# Altium footprint library ThroHoleCap.PcbLib: 81 footprints (part 1 of 6)
Each footprint in its own frame and in the unit in brackets; x right, y up, seen from the top. Pads: shape width x height; smd on the part's side, far side on the other; paste and mask are expansions set on the pad; w line width, h text height; cw(c..) or ccw(c..) is an arc to the next point about the centre after c.
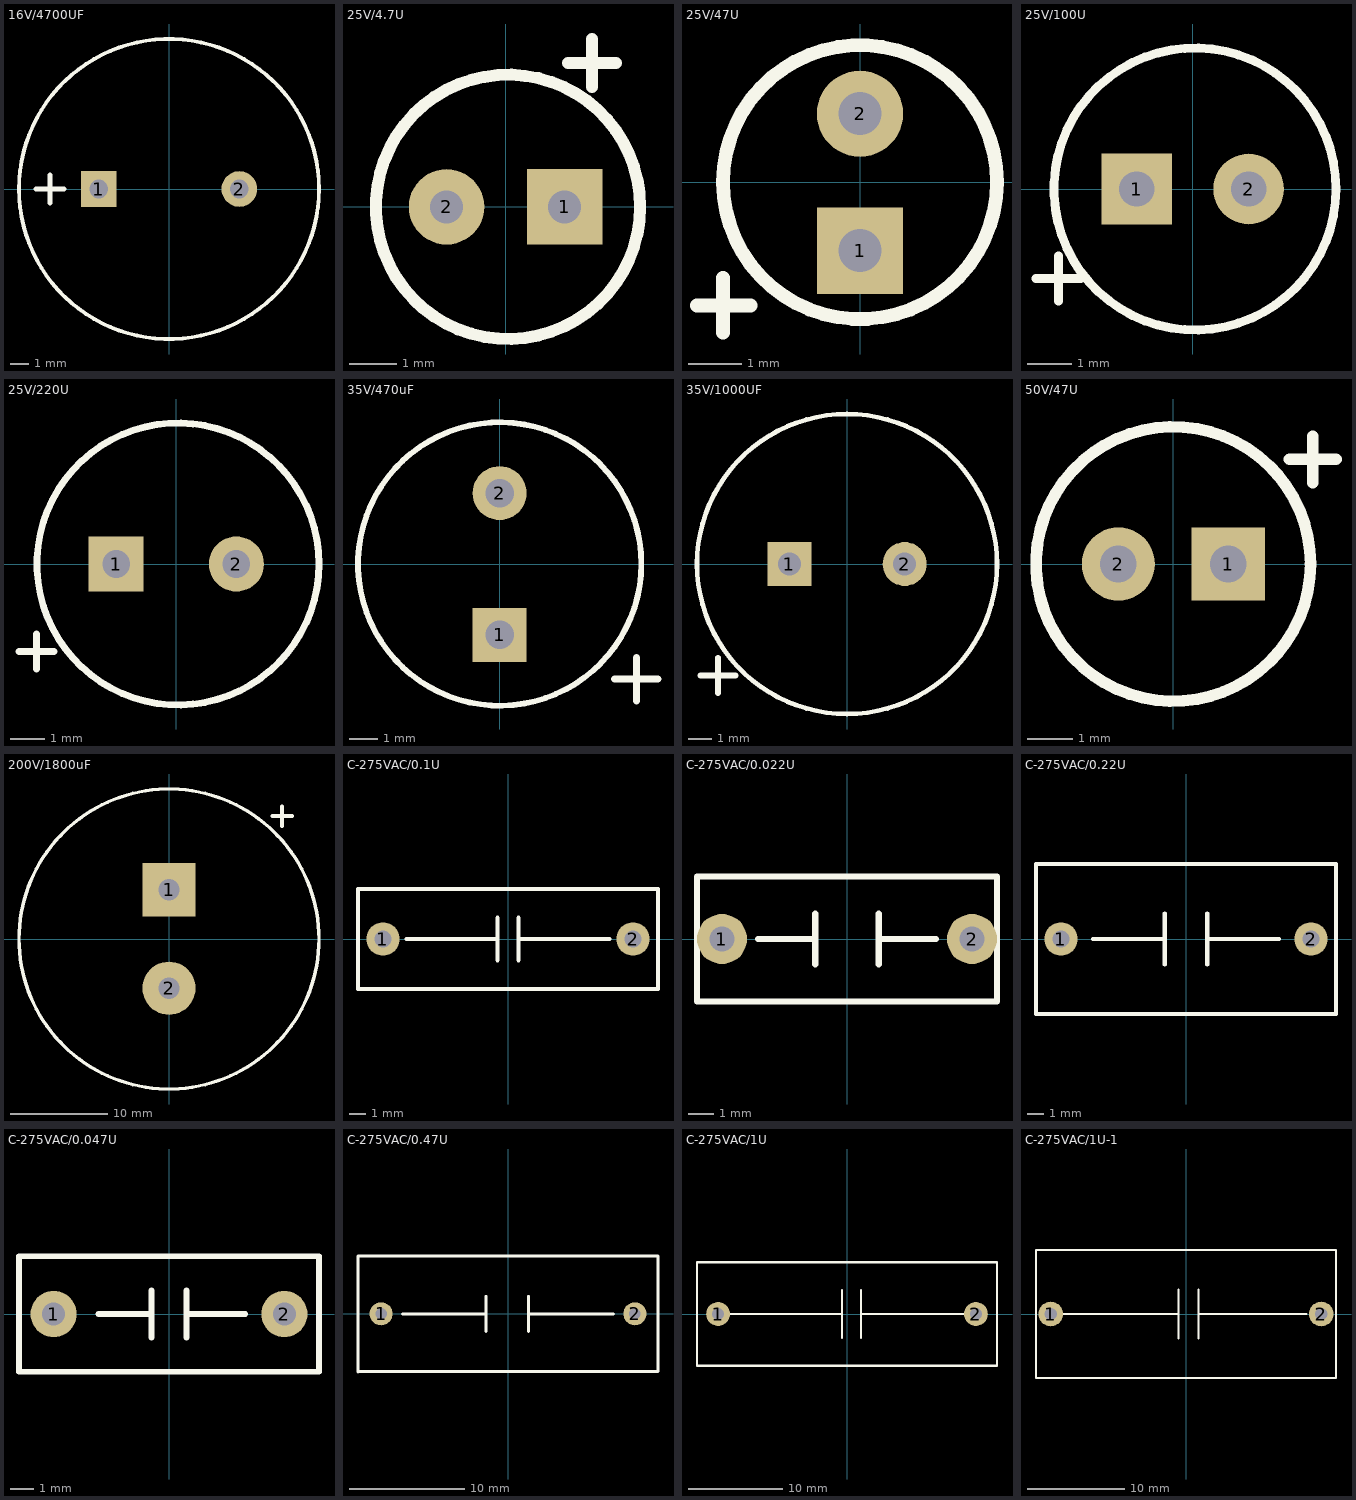
[diagram p0: the footprints below, top view; thin cyan lines are the x and y axes]

## 16V/4700UF [mm]
height 25
pads (2):
  rect 1.905x1.905 hole 1: 1(-3.75,0)
  round 1.905 hole 1: 2(3.75,0)
Top Overlay:
  circle w0.203: c0,0 r8
  lines w0.254: -7.112,0 -5.588,0 ; -6.35,-0.762 -6.35,0.762
3D body: height 25, standoff 0, extent -8,-8 8,8

## 25V/4.7U [mm]
pads (2):
  rect 1.6x1.6 hole 0.7: 1(1.25,0)
  round 1.6 hole 0.7: 2(-1.25,0)
Top Overlay:
  circle w0.254: c0.05,0 r2.8
  lines w0.254: 1.32,3.048 2.336,3.048 ; 1.828,2.54 1.828,3.556
3D body "User Library-Cap electrolitic radial 5x7.STEP": height 7.3, standoff -1.2, extent -2.433,-2.497 2.565,2.5

## 25V/47U [mm]
pads (2):
  rect 1.6x1.6 hole 0.8: 1(0,-1.27)
  round 1.6 hole 0.8: 2(0,1.27)
Top Overlay:
  circle w0.254: c0,0 r2.54
  lines w0.254: -3.023,-2.286 -2.032,-2.286 ; -2.54,-2.794 -2.54,-1.778
3D body "User Library-Cap electrolitic radial 5x7.STEP": height 7.3, standoff -1.2, extent -2.453,-2.499 2.544,2.499

## 25V/100U [mm]
pads (2):
  rect 1.6x1.6 hole 0.8: 1(-1.27,0)
  round 1.6 hole 0.8: 2(1.27,0)
Top Overlay:
  circle w0.2: c0.052,0 r3.2
  lines w0.2: -3.556,-2.032 -2.54,-2.032 ; -3.048,-2.54 -3.048,-1.524
3D body "User Library-Cap electro 6_3x12_5x2_5mm.STEP": height 13.03, standoff -3.01, extent -3.303,-3.048 3.048,3.302

## 25V/220U [mm]
pads (2):
  rect 1.6x1.6 hole 0.8: 1(-1.75,0)
  round 1.6 hole 0.8: 2(1.75,0)
Top Overlay:
  circle w0.2: c0.052,0 r4.1
  lines w0.2: -4.572,-2.54 -3.556,-2.54 ; -4.064,-3.048 -4.064,-2.032
3D body "User Library-Cap electrolitic radial 8x12.STEP": height 12.8, standoff -0.7, extent -3.998,-4.062 3.999,3.936

## 35V/470uF [mm]
pads (2):
  rect 1.905x1.905 hole 1: 1(0,-2.5)
  round 1.905 hole 1: 2(0,2.5)
Top Overlay:
  circle w0.203: c0,0 r5
  lines w0.254: 4.064,-4.064 5.588,-4.064 ; 4.826,-4.826 4.826,-3.302
3D body "User Library-Cap electrolitic radial 10x16.STEP": height 16.8, standoff -0.7, extent -4.952,-4.998 5.045,4.998

## 35V/1000UF [mm]
pads (2):
  rect 1.905x1.905 hole 1: 1(-2.5,0)
  round 1.905 hole 1: 2(2.5,0)
Top Overlay:
  circle w0.203: c0,0 r6.5
  lines w0.254: -6.35,-4.826 -4.826,-4.826 ; -5.588,-5.588 -5.588,-4.064
3D body "User Library-Cap-EL(12_5x20-5)T.STEP": height 21, standoff -3, extent -6.152,-6.242 6.35,6.258

## 50V/47U [mm]
pads (2):
  rect 1.6x1.6 hole 0.8: 1(1.2,0)
  round 1.6 hole 0.8: 2(-1.2,0)
Top Overlay:
  circle w0.254: c0,0 r3
  lines w0.254: 2.54,2.286 3.556,2.286 ; 3.048,1.778 3.048,2.794
3D body "User Library-Cap electro 6_3x12_5x2_5mm.STEP": height 13.03, standoff -3.01, extent -3.245,-3.175 3.105,3.176

## 200V/1800uF [mm]
pads (2):
  rect 5.5x5.5 hole 2.2: 1(0,5.08)
  round 5.5 hole 2.2: 2(0,-5.08)
Top Overlay:
  circle w0.35: c0,0 r15.5
  lines w0.4: 10.668,12.7 12.7,12.7 ; 11.684,11.684 11.684,13.716
3D body "User Library-Assy_CE_R400_D1200_H1450.STEP": height 37.83, standoff -5.89, extent -15.364,-15.24 15.116,15.24

## C-275VAC/0.1U [mm]
pads (2):
  round 2 hole 1: 1(-7.5,0) 2(7.5,0)
Top Overlay:
  lines w0.254: -6.096,0 -0.635,0 ; -0.635,-1.27 -0.635,1.27 ; 0.635,-1.27 0.635,1.27 ; 0.635,0 6.096,0 ; -9,-3 -9,3 9,3 9,-3 -9,-3

## C-275VAC/0.022U [mm]
pads (2):
  round 2 hole 1: 1(-5,0) 2(5,0)
Top Overlay:
  lines w0.254: -3.556,0 -1.27,0 ; -1.27,-1.016 -1.27,1.016 ; 1.27,-1.016 1.27,1.016 ; 1.27,0 3.556,0 ; -6,-2.5 -6,2.5 6,2.5 6,-2.5 -6,-2.5

## C-275VAC/0.22U [mm]
pads (2):
  round 2 hole 1: 1(-7.5,0) 2(7.5,0)
Top Overlay:
  lines w0.254: -5.588,0 -1.27,0 ; -1.27,-1.524 -1.27,1.524 ; 1.27,-1.524 1.27,1.524 ; 1.27,0 5.588,0 ; -9,-4.5 9,-4.5 9,4.5 -9,4.5 -9,-4.5

## C-275VAC/0.047U [mm]
pads (2):
  round 2 hole 1: 1(-5,0) 2(5,0)
Top Overlay:
  lines w0.254: -3.048,0 -0.762,0 ; -0.762,-1.016 -0.762,1.016 ; 0.762,-1.016 0.762,1.016 ; 0.762,0 3.302,0 ; -6.5,-2.5 6.5,-2.5 6.5,2.5 -6.5,2.5 -6.5,-2.5

## C-275VAC/0.47U [mm]
pads (2):
  round 2 hole 1: 1(-11,0) 2(11,0)
Top Overlay:
  lines w0.254: -13,-5.034 -13,5 13,5 13,-5 -13,-5 ; -9.144,0 -1.905,0 ; -1.905,-1.524 -1.905,1.524 ; 1.778,-1.524 1.778,1.524 ; 1.778,0 9.144,0

## C-275VAC/1U [mm]
pads (2):
  round 2.54 hole 1.27: 1(-13.75,0) 2(13.75,0)
Top Overlay:
  lines w0.203: -12.607,0 -0.542,0 ; -0.542,-2.54 -0.542,2.54 ; 1.49,-2.54 1.49,2.54 ; 1.49,0 12.666,0
  lines w0.254: -16,-5.5 -16,5.5 16,5.5 16,-5.5 -16,-5.5

## C-275VAC/1U-1 [mm]
pads (2):
  round 2.54 hole 1.27: 1(-13.97,0) 2(13.97,0)
Top Overlay:
  lines w0.203: -12.827,0 -0.762,0 ; -0.762,-2.54 -0.762,2.54 ; 1.27,-2.54 1.27,2.54 ; 1.27,0 12.446,0 ; -15.494,-6.604 15.494,-6.604 15.494,6.604 -15.494,6.604 -15.494,-6.604